# Altium footprint library CONN_HDR_MINI_ST_SMD.PcbLib: 102 footprints (part 6 of 7)
Each footprint in its own frame and in the unit in brackets; x right, y up, seen from the top. Pads: shape width x height; smd on the part's side, far side on the other; paste and mask are expansions set on the pad; w line width, h text height; cw(c..) or ccw(c..) is an arc to the next point about the centre after c.
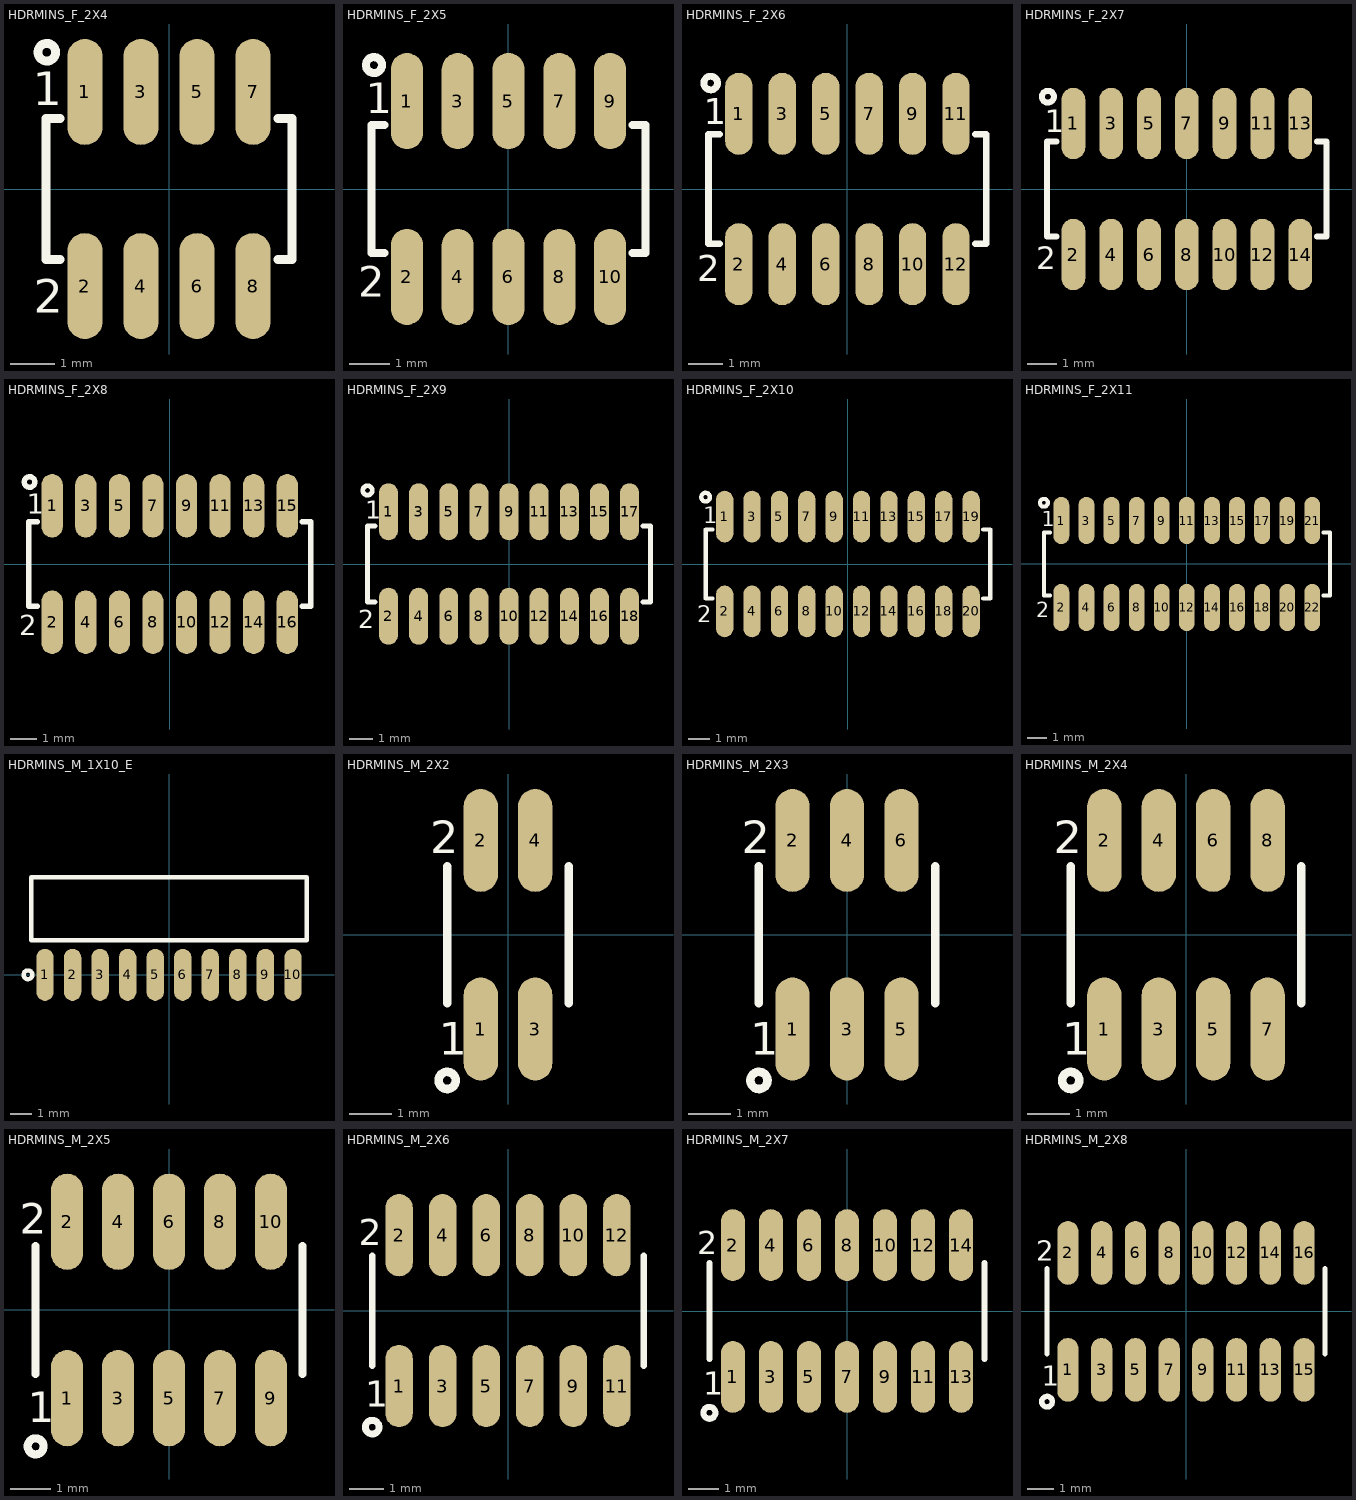
[diagram p5: the footprints below, top view; thin cyan lines are the x and y axes]

## HDRMINS_F_2X4 [mm] "HEADER FEMALE, SMT, 8, 1.27mm"
pads (8):
  oval 0.8x2.4 smd mask+0.1: 1(-1.905,2.2) 2(-1.905,-2.2) 3(-0.635,2.2) 4(-0.635,-2.2) 5(0.635,2.2) 6(0.635,-2.2) 7(1.905,2.2) 8(1.905,-2.2)
Top Overlay:
  circle w0.2: c-2.77,3.1 r0.2
  lines w0.2: -2.47,-1.6 -2.79,-1.6 -2.79,1.6 -2.47,1.6 ; 2.47,-1.6 2.79,-1.6 2.79,1.6 2.47,1.6
  text "1" at -3.09,1.9 h0.76
  text "2" at -3.07,-2.8 h0.76
3D body "User Library-1_27x1_27-SMD-female-2x2.step": height 4.5, standoff 0, extent -0.19,-2.3 2.73,2.3
3D body "User Library-1_27x1_27-SMD-female-2x2.step": height 4.5, standoff 0, extent -2.73,-2.3 0.19,2.3

## HDRMINS_F_2X5 [mm] "HEADER FEMALE, SMT, 12, 1.27mm"
pads (10):
  oval 0.8x2.4 smd mask+0.1: 1(-2.54,2.2) 2(-2.54,-2.2) 3(-1.27,2.2) 4(-1.27,-2.2) 5(0,2.2) 6(0,-2.2) 7(1.27,2.2) 8(1.27,-2.2) 9(2.54,2.2) 10(2.54,-2.2)
Top Overlay:
  circle w0.2: c-3.365,3.1 r0.2
  lines w0.2: -3.105,-1.6 -3.425,-1.6 -3.425,1.6 -3.105,1.6 ; 3.105,-1.6 3.425,-1.6 3.425,1.6 3.105,1.6
  text "1" at -3.565,1.9 h0.76
  text "2" at -3.765,-2.7 h0.76
3D body "User Library-1_27x1_27-SMD-female-2x2.step": height 4.5, standoff 0, extent 0.445,-2.3 3.365,2.3
3D body "User Library-1_27x1_27-SMD-female-2x2.step": height 4.5, standoff 0, extent -3.365,-2.3 -0.445,2.3
3D body "User Library-1_27x1_27-SMD-female-2x2.step": height 4.5, standoff 0, extent -0.825,-2.3 2.095,2.3

## HDRMINS_F_2X6 [mm] "HEADER FEMALE, SMT, 12, 1.27mm"
pads (12):
  oval 0.8x2.4 smd mask+0.1: 1(-3.175,2.2) 2(-3.175,-2.2) 3(-1.905,2.2) 4(-1.905,-2.2) 5(-0.635,2.2) 6(-0.635,-2.2) 7(0.635,2.2) 8(0.635,-2.2) 9(1.905,2.2) 10(1.905,-2.2) 11(3.175,2.2) 12(3.175,-2.2)
Top Overlay:
  circle w0.2: c-4,3.1 r0.2
  lines w0.2: -3.74,-1.6 -4.06,-1.6 -4.06,1.6 -3.74,1.6 ; 3.74,-1.6 4.06,-1.6 4.06,1.6 3.74,1.6
  text "2" at -4.4,-2.7 h0.76
  text "1" at -4.2,1.9 h0.76
3D body "User Library-1_27x1_27-SMD-female-2x2.step": height 4.5, standoff 0, extent -1.46,-2.3 1.46,2.3
3D body "User Library-1_27x1_27-SMD-female-2x2.step": height 4.5, standoff 0, extent -4,-2.3 -1.08,2.3
3D body "User Library-1_27x1_27-SMD-female-2x2.step": height 4.5, standoff 0, extent 1.08,-2.3 4,2.3

## HDRMINS_F_2X7 [mm] "HEADER FEMALE, SMT, 16, 1.27mm"
pads (14):
  oval 0.8x2.4 smd mask+0.1: 1(-3.81,2.2) 2(-3.81,-2.2) 3(-2.54,2.2) 4(-2.54,-2.2) 5(-1.27,2.2) 6(-1.27,-2.2) 7(0,2.2) 8(0,-2.2) 9(1.27,2.2) 10(1.27,-2.2) 11(2.54,2.2) 12(2.54,-2.2) 13(3.81,2.2) 14(3.81,-2.2)
Top Overlay:
  circle w0.2: c-4.665,3.1 r0.2
  lines w0.2: -4.375,-1.6 -4.695,-1.6 -4.695,1.6 -4.375,1.6 ; 4.375,-1.6 4.695,-1.6 4.695,1.6 4.375,1.6
  text "2" at -5.065,-2.7 h0.76
  text "1" at -4.765,1.9 h0.76
3D body "User Library-1_27x1_27-SMD-female-2x2.step": height 4.5, standoff 0, extent 1.715,-2.3 4.635,2.3
3D body "User Library-1_27x1_27-SMD-female-2x2.step": height 4.5, standoff 0, extent 0.445,-2.3 3.365,2.3
3D body "User Library-1_27x1_27-SMD-female-2x2.step": height 4.5, standoff 0, extent -2.095,-2.3 0.825,2.3
3D body "User Library-1_27x1_27-SMD-female-2x2.step": height 4.5, standoff 0, extent -4.635,-2.3 -1.715,2.3

## HDRMINS_F_2X8 [mm] "HEADER FEMALE, SMT, 16, 1.27mm"
pads (16):
  oval 0.8x2.4 smd mask+0.1: 1(-4.445,2.2) 2(-4.445,-2.2) 3(-3.175,2.2) 4(-3.175,-2.2) 5(-1.905,2.2) 6(-1.905,-2.2) 7(-0.635,2.2) 8(-0.635,-2.2) 9(0.635,2.2) 10(0.635,-2.2) 11(1.905,2.2) 12(1.905,-2.2) 13(3.175,2.2) 14(3.175,-2.2) 15(4.445,2.2) 16(4.445,-2.2)
Top Overlay:
  circle w0.2: c-5.3,3.1 r0.2
  lines w0.2: -5.01,-1.6 -5.33,-1.6 -5.33,1.6 -5.01,1.6 ; 5.01,-1.6 5.33,-1.6 5.33,1.6 5.01,1.6
  text "1" at -5.4,1.9 h0.76
  text "2" at -5.7,-2.7 h0.76
3D body "User Library-1_27x1_27-SMD-female-2x2.step": height 4.5, standoff 0, extent -5.27,-2.3 -2.35,2.3
3D body "User Library-1_27x1_27-SMD-female-2x2.step": height 4.5, standoff 0, extent -2.73,-2.3 0.19,2.3
3D body "User Library-1_27x1_27-SMD-female-2x2.step": height 4.5, standoff 0, extent -0.19,-2.3 2.73,2.3
3D body "User Library-1_27x1_27-SMD-female-2x2.step": height 4.5, standoff 0, extent 2.35,-2.3 5.27,2.3

## HDRMINS_F_2X9 [mm] "HEADER FEMALE, SMT, 20, 1.27mm"
pads (18):
  oval 0.8x2.4 smd mask+0.1: 1(-5.08,2.2) 2(-5.08,-2.2) 3(-3.81,2.2) 4(-3.81,-2.2) 5(-2.54,2.2) 6(-2.54,-2.2) 7(-1.27,2.2) 8(-1.27,-2.2) 9(0,2.2) 10(0,-2.2) 11(1.27,2.2) 12(1.27,-2.2) 13(2.54,2.2) 14(2.54,-2.2) 15(3.81,2.2) 16(3.81,-2.2) 17(5.08,2.2) 18(5.08,-2.2)
Top Overlay:
  circle w0.2: c-5.965,3.1 r0.2
  lines w0.2: -5.645,-1.6 -5.965,-1.6 -5.965,1.6 -5.645,1.6 ; 5.645,-1.6 5.965,-1.6 5.965,1.6 5.645,1.6
  text "2" at -6.365,-2.7 h0.76
  text "1" at -6.065,1.9 h0.76
3D body "User Library-1_27x1_27-SMD-female-2x2.step": height 4.5, standoff 0, extent -5.905,-2.3 -2.985,2.3
3D body "User Library-1_27x1_27-SMD-female-2x2.step": height 4.5, standoff 0, extent -3.365,-2.3 -0.445,2.3
3D body "User Library-1_27x1_27-SMD-female-2x2.step": height 4.5, standoff 0, extent -0.825,-2.3 2.095,2.3
3D body "User Library-1_27x1_27-SMD-female-2x2.step": height 4.5, standoff 0, extent 1.715,-2.3 4.635,2.3
3D body "User Library-1_27x1_27-SMD-female-2x2.step": height 4.5, standoff 0, extent 2.985,-2.3 5.905,2.3

## HDRMINS_F_2X10 [mm] "HEADER FEMALE, SMT, 20, 1.27mm"
pads (20):
  oval 0.8x2.4 smd mask+0.1: 1(-5.715,2.2) 2(-5.715,-2.2) 3(-4.445,2.2) 4(-4.445,-2.2) 5(-3.175,2.2) 6(-3.175,-2.2) 7(-1.905,2.2) 8(-1.905,-2.2) 9(-0.635,2.2) 10(-0.635,-2.2) 11(0.635,2.2) 12(0.635,-2.2) 13(1.905,2.2) 14(1.905,-2.2) 15(3.175,2.2) 16(3.175,-2.2) 17(4.445,2.2) 18(4.445,-2.2) 19(5.715,2.2) 20(5.715,-2.2)
Top Overlay:
  circle w0.2: c-6.6,3.1 r0.2
  lines w0.2: -6.28,-1.6 -6.6,-1.6 -6.6,1.6 -6.28,1.6 ; 6.28,-1.6 6.6,-1.6 6.6,1.6 6.28,1.6
  text "2" at -7,-2.7 h0.76
  text "1" at -6.7,1.9 h0.76
3D body "User Library-1_27x1_27-SMD-female-2x2.step": height 4.5, standoff 0, extent -6.54,-2.3 -3.62,2.3
3D body "User Library-1_27x1_27-SMD-female-2x2.step": height 4.5, standoff 0, extent -4,-2.3 -1.08,2.3
3D body "User Library-1_27x1_27-SMD-female-2x2.step": height 4.5, standoff 0, extent -1.46,-2.3 1.46,2.3
3D body "User Library-1_27x1_27-SMD-female-2x2.step": height 4.5, standoff 0, extent 1.08,-2.3 4,2.3
3D body "User Library-1_27x1_27-SMD-female-2x2.step": height 4.5, standoff 0, extent 3.62,-2.3 6.54,2.3

## HDRMINS_F_2X11 [mm] "HEADER FEMALE, SMT, 20, 1.27mm"
pads (22):
  oval 0.8x2.4 smd mask+0.1: 1(-6.35,2.2) 2(-6.35,-2.2) 3(-5.08,2.2) 4(-5.08,-2.2) 5(-3.81,2.2) 6(-3.81,-2.2) 7(-2.54,2.2) 8(-2.54,-2.2) 9(-1.27,2.2) 10(-1.27,-2.2) 11(0,2.2) 12(0,-2.2) 13(1.27,2.2) 14(1.27,-2.2) 15(2.54,2.2) 16(2.54,-2.2) 17(3.81,2.2) 18(3.81,-2.2) 19(5.08,2.2) 20(5.08,-2.2) 21(6.35,2.2) 22(6.35,-2.2)
Top Overlay:
  circle w0.2: c-7.235,3.1 r0.2
  lines w0.2: -6.915,-1.6 -7.235,-1.6 -7.235,1.6 -6.915,1.6 ; 6.915,-1.6 7.235,-1.6 7.235,1.6 6.915,1.6
  text "2" at -7.635,-2.7 h0.76
  text "1" at -7.335,1.9 h0.76
3D body "User Library-1_27x1_27-SMD-female-2x2.step": height 4.5, standoff 0, extent 4.255,-2.3 7.175,2.3
3D body "User Library-1_27x1_27-SMD-female-2x2.step": height 4.5, standoff 0, extent -7.175,-2.3 -4.255,2.3
3D body "User Library-1_27x1_27-SMD-female-2x2.step": height 4.5, standoff 0, extent -4.635,-2.3 -1.715,2.3
3D body "User Library-1_27x1_27-SMD-female-2x2.step": height 4.5, standoff 0, extent -2.095,-2.3 0.825,2.3
3D body "User Library-1_27x1_27-SMD-female-2x2.step": height 4.5, standoff 0, extent 0.445,-2.3 3.365,2.3
3D body "User Library-1_27x1_27-SMD-female-2x2.step": height 4.5, standoff 0, extent 2.985,-2.3 5.905,2.3

## HDRMINS_M_1X10_E [mm] "mini header (50mil pitch)"
pads (10):
  oval 0.8x2.4 smd mask+0.1: 1(-5.715,0) 2(-4.445,0) 3(-3.175,0) 4(-1.905,0) 5(-0.635,0) 6(0.635,0) 7(1.905,0) 8(3.175,0) 9(4.445,0) 10(5.715,0)
Top Overlay:
  circle w0.2: c-6.5,0 r0.2
  lines w0.2: -6.35,1.6 6.35,1.6 6.35,4.5 -6.35,4.5 -6.35,1.6
3D body: height 0.84, standoff -0.44, extent -6.35,1.6 -5.08,4.4
3D body: height 0.4, standoff 0, extent -5.915,-0.9 -5.515,8.9
3D body: height 0.4, standoff 0, extent -4.645,-0.9 -4.245,8.9
3D body: height 0.84, standoff -0.44, extent -5.08,1.6 -3.81,4.4
3D body: height 0.4, standoff 0, extent -3.375,-0.9 -2.975,8.9
3D body: height 0.84, standoff -0.44, extent -3.81,1.6 -2.54,4.4
3D body: height 0.4, standoff 0, extent -2.105,-0.9 -1.705,8.9
3D body: height 0.84, standoff -0.44, extent -2.54,1.6 -1.27,4.4
3D body: height 0.4, standoff 0, extent -0.835,-0.9 -0.435,8.9
3D body: height 0.84, standoff -0.44, extent -1.27,1.6 0,4.4
3D body: height 0.4, standoff 0, extent 0.435,-0.9 0.835,8.9
3D body: height 0.84, standoff -0.44, extent 0,1.6 1.27,4.4
3D body: height 0.4, standoff 0, extent 1.705,-0.9 2.105,8.9
3D body: height 0.84, standoff -0.44, extent 1.27,1.6 2.54,4.4
3D body: height 0.4, standoff 0, extent 2.975,-0.9 3.375,8.9
3D body: height 0.84, standoff -0.44, extent 2.54,1.6 3.81,4.4
3D body: height 0.4, standoff 0, extent 4.245,-0.9 4.645,8.9
3D body: height 0.84, standoff -0.44, extent 3.81,1.6 5.08,4.4
3D body: height 0.4, standoff 0, extent 5.515,-0.9 5.915,8.9
3D body: height 0.84, standoff -0.44, extent 5.08,1.6 6.35,4.4

## HDRMINS_M_2X2 [mm] "FCI Minitek127® BTB, HEADER UNSHROUDED, SMT, 4, 1.27mm"
pads (4):
  oval 0.8x2.4 smd mask+0.1: 1(-0.635,-2.2) 2(-0.635,2.2) 3(0.635,-2.2) 4(0.635,2.2)
Top Overlay:
  circle w0.2: c-1.42,-3.4 r0.2
  lines w0.2: -1.42,-1.6 -1.42,1.6 ; 1.42,-1.6 1.42,1.6
  text "2" at -1.82,1.9 h0.76
  text "1" at -1.62,-2.8 h0.76
3D body "20021121-00004XXLFc.stp": height 4.5, standoff 0, extent -1.27,-2.75 1.27,2.75

## HDRMINS_M_2X3 [mm] "FCI Minitek127® BTB, HEADER UNSHROUDED, SMT, 6, 1.27mm"
pads (6):
  oval 0.8x2.4 smd mask+0.1: 1(-1.27,-2.2) 2(-1.27,2.2) 3(0,-2.2) 4(0,2.2) 5(1.27,-2.2) 6(1.27,2.2)
Top Overlay:
  circle w0.2: c-2.055,-3.4 r0.2
  lines w0.2: -2.055,-1.6 -2.055,1.6 ; 2.055,-1.6 2.055,1.6
  text "1" at -2.255,-2.8 h0.76
  text "2" at -2.455,1.9 h0.76
3D body "20021121-00006XXLFc.stp": height 4.5, standoff 0, extent -1.905,-2.75 1.905,2.75

## HDRMINS_M_2X4 [mm] "FCI Minitek127® BTB, HEADER UNSHROUDED, SMT, 8, 1.27mm"
pads (8):
  oval 0.8x2.4 smd mask+0.1: 1(-1.905,-2.2) 2(-1.905,2.2) 3(-0.635,-2.2) 4(-0.635,2.2) 5(0.635,-2.2) 6(0.635,2.2) 7(1.905,-2.2) 8(1.905,2.2)
Top Overlay:
  circle w0.2: c-2.69,-3.4 r0.2
  lines w0.2: -2.69,-1.6 -2.69,1.6 ; 2.69,-1.6 2.69,1.6
  text "2" at -3.09,1.9 h0.76
  text "1" at -2.89,-2.8 h0.76
3D body "20021121-00004XXLFc.stp": height 4.5, standoff 0, extent 0,-2.75 2.54,2.75
3D body "20021121-00004XXLFc.stp": height 4.5, standoff 0, extent -2.54,-2.75 0,2.75

## HDRMINS_M_2X5 [mm] "FCI Minitek127® BTB, HEADER UNSHROUDED, SMT, 10, 1.27mm"
pads (10):
  oval 0.8x2.4 smd mask+0.1: 1(-2.54,-2.2) 2(-2.54,2.2) 3(-1.27,-2.2) 4(-1.27,2.2) 5(0,-2.2) 6(0,2.2) 7(1.27,-2.2) 8(1.27,2.2) 9(2.54,-2.2) 10(2.54,2.2)
Top Overlay:
  circle w0.2: c-3.325,-3.4 r0.2
  lines w0.2: -3.325,-1.6 -3.325,1.6 ; 3.325,-1.6 3.325,1.6
  text "1" at -3.525,-2.8 h0.76
  text "2" at -3.725,1.9 h0.76
3D body "20021121-00006XXLFc.stp": height 4.5, standoff 0, extent -0.635,-2.75 3.175,2.75
3D body "20021121-00004XXLFc.stp": height 4.5, standoff 0, extent -3.175,-2.75 -0.635,2.75

## HDRMINS_M_2X6 [mm] "FCI Minitek127® BTB, HEADER UNSHROUDED, SMT, 12, 1.27mm"
pads (12):
  oval 0.8x2.4 smd mask+0.1: 1(-3.175,-2.2) 2(-3.175,2.2) 3(-1.905,-2.2) 4(-1.905,2.2) 5(-0.635,-2.2) 6(-0.635,2.2) 7(0.635,-2.2) 8(0.635,2.2) 9(1.905,-2.2) 10(1.905,2.2) 11(3.175,-2.2) 12(3.175,2.2)
Top Overlay:
  circle w0.2: c-3.96,-3.4 r0.2
  lines w0.2: -3.96,-1.6 -3.96,1.6 ; 3.96,-1.6 3.96,1.6
  text "2" at -4.36,1.9 h0.76
  text "1" at -4.16,-2.8 h0.76
3D body "20021121-00004XXLFc.stp": height 4.5, standoff 0, extent 1.27,-2.75 3.81,2.75
3D body "20021121-00004XXLFc.stp": height 4.5, standoff 0, extent -1.27,-2.75 1.27,2.75
3D body "20021121-00004XXLFc.stp": height 4.5, standoff 0, extent -3.81,-2.75 -1.27,2.75

## HDRMINS_M_2X7 [mm] "FCI Minitek127® BTB, HEADER UNSHROUDED, SMT, 14, 1.27mm"
pads (14):
  oval 0.8x2.4 smd mask+0.1: 1(-3.81,-2.2) 2(-3.81,2.2) 3(-2.54,-2.2) 4(-2.54,2.2) 5(-1.27,-2.2) 6(-1.27,2.2) 7(0,-2.2) 8(0,2.2) 9(1.27,-2.2) 10(1.27,2.2) 11(2.54,-2.2) 12(2.54,2.2) 13(3.81,-2.2) 14(3.81,2.2)
Top Overlay:
  circle w0.2: c-4.595,-3.4 r0.2
  lines w0.2: -4.595,-1.6 -4.595,1.6 ; 4.595,-1.6 4.595,1.6
  text "1" at -4.795,-2.8 h0.76
  text "2" at -4.995,1.9 h0.76
3D body "20021121-00004XXLFc.stp": height 4.5, standoff 0, extent -4.445,-2.75 -1.905,2.75
3D body "20021121-00006XXLFc.stp": height 4.5, standoff 0, extent -1.905,-2.75 1.905,2.75
3D body "20021121-00004XXLFc.stp": height 4.5, standoff 0, extent 1.905,-2.75 4.445,2.75

## HDRMINS_M_2X8 [mm] "FCI Minitek127® BTB, HEADER UNSHROUDED, SMT, 16, 1.27mm"
pads (16):
  oval 0.8x2.4 smd mask+0.1: 1(-4.445,-2.2) 2(-4.445,2.2) 3(-3.175,-2.2) 4(-3.175,2.2) 5(-1.905,-2.2) 6(-1.905,2.2) 7(-0.635,-2.2) 8(-0.635,2.2) 9(0.635,-2.2) 10(0.635,2.2) 11(1.905,-2.2) 12(1.905,2.2) 13(3.175,-2.2) 14(3.175,2.2) 15(4.445,-2.2) 16(4.445,2.2)
Top Overlay:
  circle w0.2: c-5.23,-3.4 r0.2
  lines w0.2: -5.23,-1.6 -5.23,1.6 ; 5.23,-1.6 5.23,1.6
  text "2" at -5.63,1.9 h0.76
  text "1" at -5.43,-2.8 h0.76
3D body "20021121-00004XXLFc.stp": height 4.5, standoff 0, extent 0,-2.75 2.54,2.75
3D body "20021121-00004XXLFc.stp": height 4.5, standoff 0, extent 2.54,-2.75 5.08,2.75
3D body "20021121-00004XXLFc.stp": height 4.5, standoff 0, extent -5.08,-2.75 -2.54,2.75
3D body "20021121-00004XXLFc.stp": height 4.5, standoff 0, extent -2.54,-2.75 0,2.75